# Altium footprint library 9-Pcblib_Con.PcbLib: 266 footprints (part 17 of 17)
Each footprint in its own frame and in the unit in brackets; x right, y up, seen from the top. Pads: shape width x height; smd on the part's side, far side on the other; paste and mask are expansions set on the pad; w line width, h text height; cw(c..) or ccw(c..) is an arc to the next point about the centre after c.
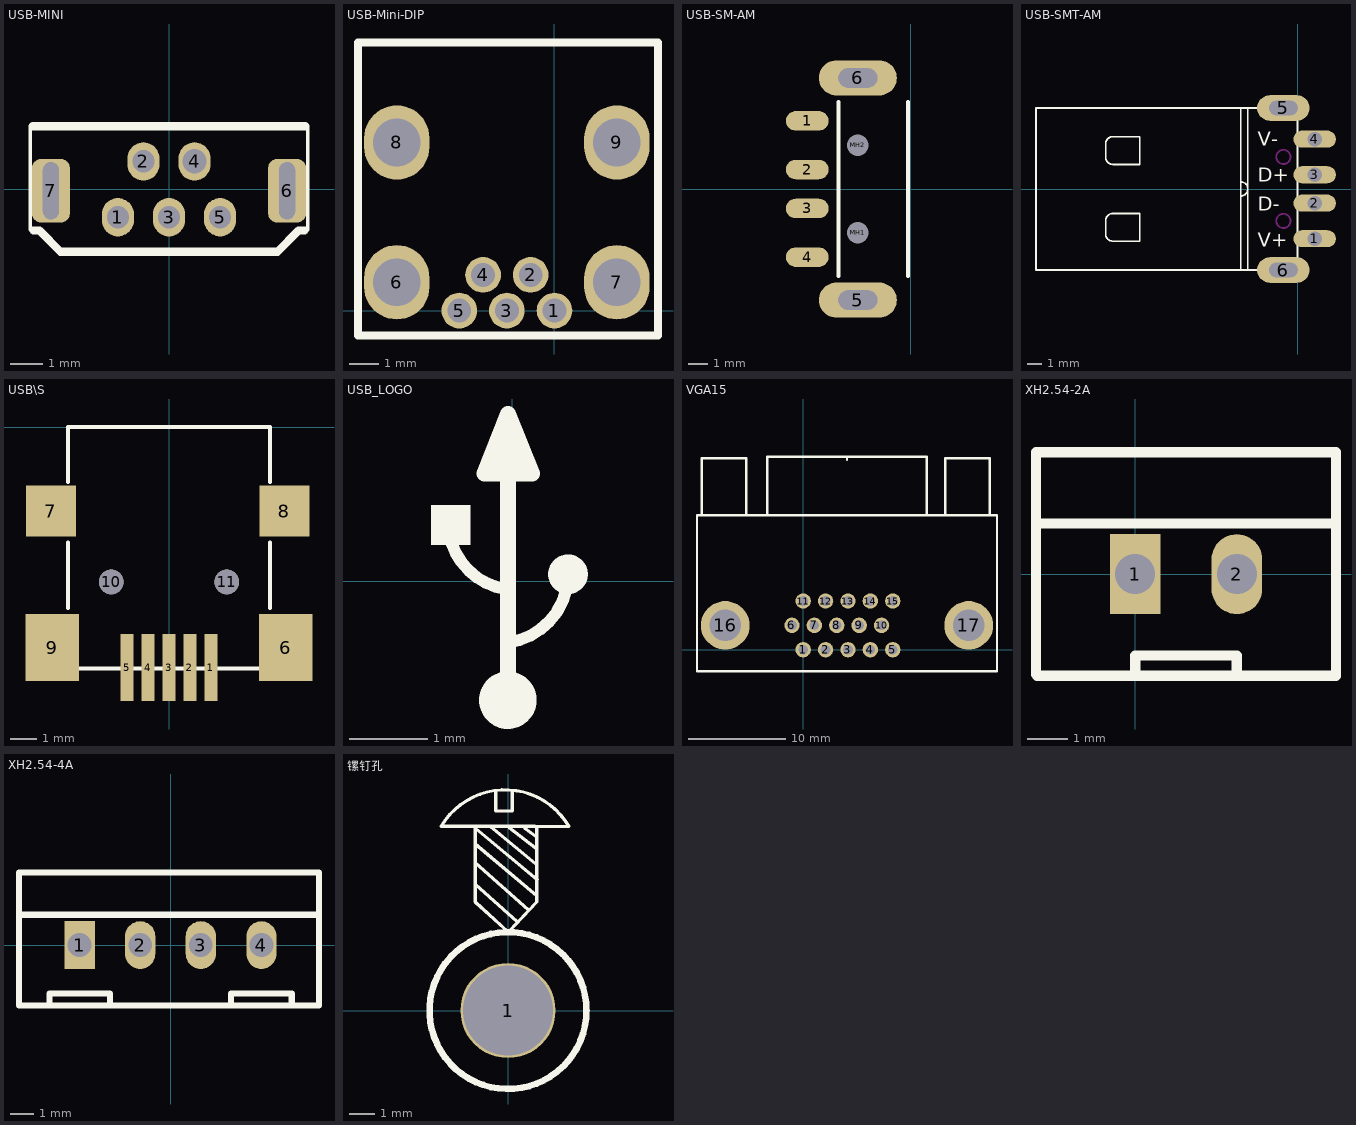
[diagram p16: the footprints below, top view; thin cyan lines are the x and y axes]

## USB-MINI [mm]
height 5.08
pads (7):
  oval 1x1.2 hole 0.7: 1(-1.6,-0.875) 2(-0.8,0.875) 3(0,-0.875) 5(1.6,-0.875)
  oval 1x1.2 hole 0.762: 4(0.8,0.875)
  rrect50% 1.2x2 hole 0.5 slot 1.8 at 90 deg: 6(3.7,-0.045) 7(-3.7,-0.045)
Top Overlay:
  lines w0.1: -4.35,-1.27 -4.35,1.95 ; 4.35,-1.27 4.35,1.95
  lines w0.254: -4.27,1.975 4.27,1.975 ; -4.25,-1.295 -4.06,-1.295 -3.4,-1.955 3.4,-1.955 4.06,-1.295 4.166,-1.295 4.25,-1.295

## USB-Mini-DIP [mm]
pads (9):
  round 1.2 hole 0.8: 1(0,0) 2(-0.8,1.2) 3(-1.6,0) 4(-2.4,1.2) 5(-3.2,0)
  oval 2.2x2.5 hole 1.6: 6(-5.3,0.95) 7(2.1,0.95) 8(-5.3,5.65) 9(2.1,5.65)
Top Overlay:
  lines w0.254: 3.455,-0.813 3.429,-0.838 -6.604,-0.838 -6.604,-0.61 -6.604,9.012 3.48,9.012 3.48,-0.686 ; 3.48,-0.838 3.48,-0.635

## USB-SM-AM [mm]
height 5.08
pads (8):
  oval 2.2x1 smd: 1(-5.309,3.5) 2(-5.309,1) 3(-5.309,-1) 4(-5.309,-3.5)
  oval 4x1.8 hole 1 slot 2 at 0 deg: 5(-2.709,-5.7) 6(-2.709,5.7)
  round 0.8 hole 1.1 unplated: MH1(-2.709,-2.25) MH2(-2.709,2.25)
Top Overlay:
  lines w0.2: -3.709,-4.475 -3.709,4.475 ; -0.127,-4.475 -0.127,4.475
Multi-Layer:
  lines w1: -3.459,-5.7 -1.959,-5.7 ; -3.459,5.7 -1.959,5.7

## USB-SMT-AM [mm]
height 5
pads (6):
  oval 3x1.2 hole 1: 1(1.2,-3.497) 2(1.2,-0.997) 3(1.2,1.003) 4(1.2,3.503)
  oval 3.7x1.8 hole 1 slot 2 at 0 deg unplated: 5(-1.002,5.698)
  oval 3.7x1.8 hole 1 slot 2 at 0 deg: 6(-1.002,-5.698)
Top Overlay:
  lines w0.127: -4.002,-5.695 -4.002,5.705 ; -4.002,-0.495 ccw(c-4.002,0.005) -4.002,0.505 ; -3.502,-5.695 -3.502,5.705 ; -2.402,-5.695 -18.402,-5.695 -18.402,5.705 -2.402,5.705 ; -0.002,-5.205 -0.002,5.215 ; -13.502,-3.17 ccw(c-13.002,-3.17) -13.002,-3.67 -11.102,-3.67 -11.102,-1.72 -13.002,-1.72 ccw(c-13.002,-2.22) -13.502,-2.22 -13.502,-3.17 ; -13.502,2.23 ccw(c-13.002,2.23) -13.002,1.73 -11.102,1.73 -11.102,3.68 -13.002,3.68 ccw(c-13.002,3.18) -13.502,3.18 -13.502,2.23
  text "D-" at -2.794,-1.524 h1
  text "V-" at -2.794,3.048 h1
  text "V+" at -2.794,-4.064 h1
  text "D+" at -2.794,0.508 h1
Keep-Out Layer:
  circle w0.127: c-1.002,2.255 r0.5
  circle w0.127: c-1.002,-2.245 r0.5
3D body: height 4.52, standoff -1.18, extent -18.676,-6.172 1.354,6.328

## USB\S [mm]
pads (11):
  rect 0.508x2.54 smd: 1(1.6,-9.162) 2(0.8,-9.162) 3(0,-9.162) 4(-0.8,-9.162) 5(-1.6,-9.162)
  rect 2.032x2.54 smd: 6(4.445,-8.4) 9(-4.445,-8.4)
  rect 1.9x1.95 smd: 7(-4.5,-3.2) 8(4.4,-3.2)
  round 0.94 hole 0.94 unplated: 10(-2.2,-5.9) 11(2.2,-5.9)
Top Overlay:
  lines w0.152: -3.85,-6.9 -3.85,-4.4 ; -3.85,-2.1 -3.85,0 3.85,0 3.85,-2.1 ; -3.8,-9.2 3.8,-9.2 ; 3.85,-6.9 3.85,-4.4
3D body: height 3.9, standoff -1.1, extent -4.95,-9.459 4.95,-0.063

## USB_LOGO [mm]
height 10.16
Top Overlay:
  circle w0.254: c0.716,0.09 r0.127
  circle w0.381: c-0.053,-1.518 r0.178
  rectangle: -1.039,0.463 -0.529,0.973
  lines w0.152: -0.779,0.504 ccw(c0.068,0.774) -0.051,-0.107 ; -0.051,-0.784 ccw(c-0.171,0.097) 0.717,0.046
  lines w0.203: -0.051,-1.384 -0.051,2.139 ; -0.051,1.375 -0.051,2.139 ; -0.051,2.139 0.259,1.377 -0.351,1.377 -0.051,2.139
  lines w0.381: -0.051,1.479 -0.051,1.58

## VGA15 [mm]
pads (17):
  round 1.58 hole 1: 1(0,0) 2(2.3,0) 3(4.6,0) 4(6.9,0) 5(9.2,0) 6(-1.15,2.5) 7(1.15,2.5) 8(3.45,2.5) 9(5.75,2.5) 10(8.05,2.5) 11(0,5) 12(2.3,5) 13(4.6,5) 14(6.9,5) 15(9.2,5)
  round 5 hole 3.25: 16(-8,2.5) 17(17,2.5)
Top Overlay:
  lines w0.254: -10.9,-2.2 -10.9,13.8 19.9,13.8 19.9,-2.2 -10.89,-2.2 -10.9,-2.19 ; -10.4,13.8 -10.4,19.67 -5.83,19.67 -5.83,13.82 ; -3.7,13.8 -3.7,19.8 12.7,19.8 12.7,13.8 ; 4.5,19.5 4.5,19.8 ; 14.6,13.8 14.6,19.68 19.18,19.68 19.18,13.84
3D body: height 12.77, standoff -3.27, extent -11.055,-0.875 19.755,20.225

## XH2.54-2A [mm]
pads (2):
  rect 1.27x2 hole 1: 1(0,0)
  oval 1.27x2 hole 1: 2(2.54,0)
Top Overlay:
  lines w0.254: -2.426,1.27 -1.27,1.27 5.02,1.27 ; 0,-2.54 0,-2.032 2.54,-2.032 2.54,-2.54 ; -2.48,-2.511 -2.451,-2.54 5.02,-2.54 5.02,3.048 -2.48,3.048 -2.48,-2.511

## XH2.54-4A [mm]
pads (4):
  rect 1.27x2 hole 1: 1(-3.81,0)
  oval 1.27x2 hole 1: 2(-1.27,0) 3(1.27,0) 4(3.81,0)
Top Overlay:
  lines w0.254: -6.35,1.27 -5.08,1.27 2.54,1.27 3.81,1.27 6.096,1.27 ; -5.08,-2.54 -5.08,-2.032 -2.54,-2.032 -2.54,-2.54 ; -5.08,3.048 2.54,3.048 ; 2.54,-2.54 2.54,-2.032 5.08,-2.032 5.08,-2.54 ; -6.35,-2.54 -6.35,3.048 6.223,3.048 6.223,-2.54 -6.35,-2.54
3D body: height 7.1, standoff -2.9, extent -6.426,-2.574 6.274,3.226

## 镙钉孔 [mm]
pads (1):
  round 3.7 hole 3.5: 1(0,0)
Top Overlay:
  circle w0.254: c0,0 r3.05
  lines w0.127: -1.278,4.91 0.356,3.454 ; -1.278,5.744 0.782,3.916 ; -1.278,6.472 1.119,4.466 ; -1.242,7.058 1.137,5.087 ; -0.674,7.147 1.066,5.709 ; -0.479,8.531 -0.479,7.75 0.16,7.75 0.16,8.531 ; 0.036,7.111 1.066,6.312 ; 0.64,7.093 1.066,6.774 ; 1.048,7.164 -1.278,7.164 ; -1.278,7.164 -2.591,7.164 cw(c-0.113,5.698) 2.373,7.15 1.119,7.147 1.119,4.218 0.018,3.046 -1.278,4.218 -1.278,7.164
Bottom Overlay:
  circle w0.2: c0,0 r3.05
  lines w0.2: -2.587,7.212 cw(c-0.169,5.818) 2.276,7.163
  lines w0.254: -2.534,7.182 -2.547,7.194 2.333,7.194 ; -1.208,7.057 -1.208,4.279 0.006,3.065 1.17,4.229 1.17,7.032 ; -0.482,8.533 -0.47,8.546 -0.47,7.795 0.181,7.795 0.181,8.446